# Altium footprint library Misc.PCBLIB: 128 footprints (part 5 of 8)
Each footprint in its own frame and in the unit in brackets; x right, y up, seen from the top. Pads: shape width x height; smd on the part's side, far side on the other; paste and mask are expansions set on the pad; w line width, h text height; cw(c..) or ccw(c..) is an arc to the next point about the centre after c.
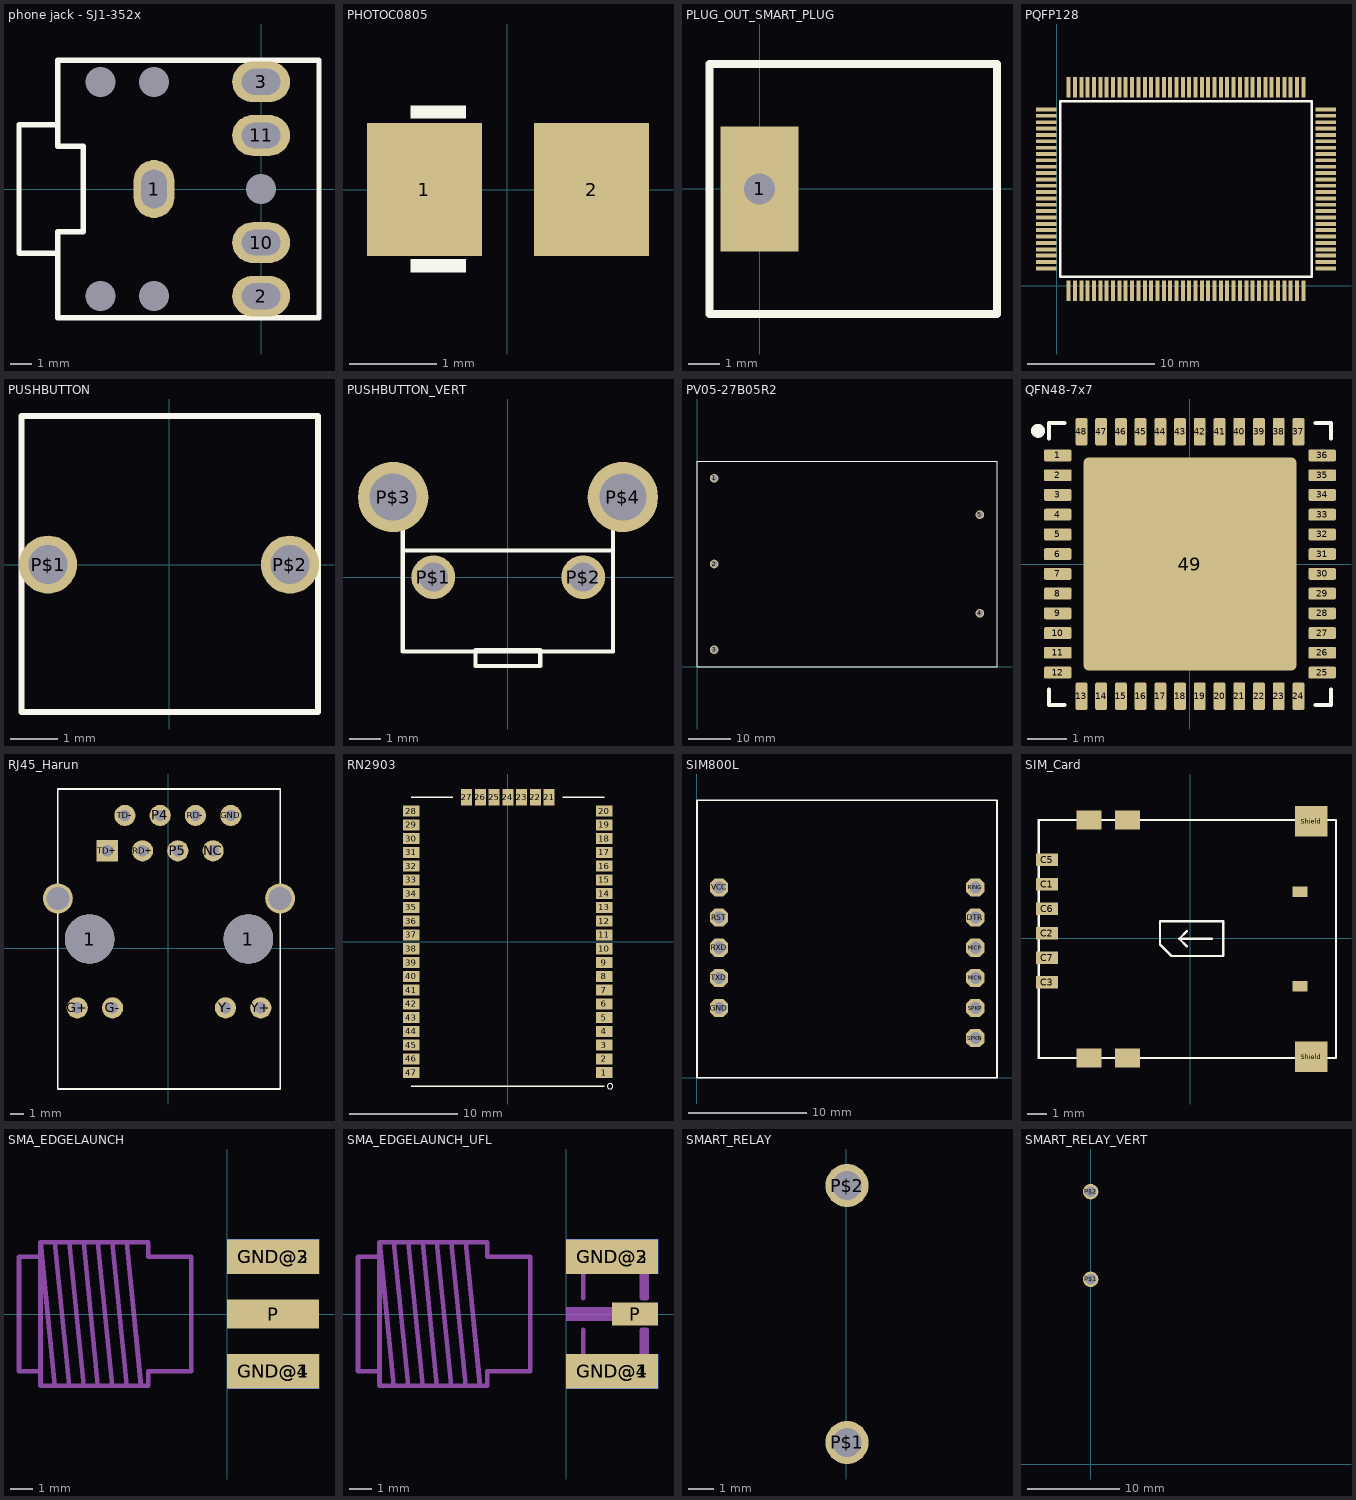
[diagram p4: the footprints below, top view; thin cyan lines are the x and y axes]

## phone jack - SJ1-352x [mm]
pads (10):
  round 0 hole 1.4: 0(-7.5,-5) 0(-7.5,5) 0(-5,-5) 0(-5,5) 0(0,0)
  oval 1.9x2.7 hole 1.2 slot 1.8 at 90 deg: 1(-5,0)
  oval 2.7x1.9 hole 1.2 slot 1.8 at 0 deg: 2(0,-5) 3(0,5) 10(0,-2.5) 11(0,2.5)
Top Overlay:
  lines w0.254: -9.5,-3 -9.5,-2 -8.3,-2 -8.3,2 -9.5,2 -9.5,3 ; -9.5,-3 -9.5,-6 2.7,-6 2.7,6 -9.5,6 -9.5,3 ; -9.5,-3 -11.3,-3 -11.3,3 -9.5,3
3D body "CUI_SJ1-3525NG.step": height 6, standoff -2.8, extent -11.55,-6 2.5,6

## PHOTOC0805 [mil]
pads (2):
  rect 52x60 smd: 1(-37.4,0) 2(38,0)
Top Overlay:
  rectangle: -43.75,32 -18.75,38
  rectangle: -43.75,-37.5 -18.75,-31.25

## PLUG_OUT_SMART_PLUG [mm]
pads (1):
  rect 2.5x4 hole 1 square: 1(0,0)
Top Overlay:
  lines w0.254: -1.6,-4 -1.6,4 7.6,4 7.6,-4 -1.6,-4
3D body "TOMADA_25-09-2017 v1_Terminal saida v1.step": height 13.96, standoff -5, extent -0.35,-4 7.65,4

## PQFP128 [mil]
pads (128):
  rect 12x63 smd: 1(36,-14.96) 2(56,-14.96) 3(76,-14.96) 4(95,-14.96) 5(115,-14.96) 6(135,-14.96) 7(154,-14.96) 8(174,-14.96) 9(194,-14.96) 10(213,-14.96) 11(233,-14.96) 12(253,-14.96) 13(273,-14.96) 14(292,-14.96) 15(312,-14.96) 16(332,-14.96) 17(351,-14.96) 18(371,-14.96) 19(391,-14.96) 20(410,-14.96) 21(430,-14.96) 22(450,-14.96) 23(469,-14.96) 24(489,-14.96) 25(509,-14.96) 26(528,-14.96) 27(548,-14.96) 28(568,-14.96) 29(588,-14.96) 30(607,-14.96) 31(627,-14.96) 32(647,-14.96) 33(666,-14.96) 34(686,-14.96) 35(706,-14.96) 36(725,-14.96) 37(745,-14.96) 38(765,-14.96) 65(765,615) 66(745,615) 67(725,615) 68(706,615) 69(686,615) 70(666,615) 71(647,615) 72(627,615) 73(607,615) 74(588,615) 75(568,615) 76(548,615) 77(528,615) 78(509,615) 79(489,615) 80(469,615) 81(450,615) 82(430,615) 83(410,615) 84(391,615) 85(371,615) 86(351,615) 87(332,615) 88(312,615) 89(292,615) 90(273,615) 91(253,615) 92(233,615) 93(213,615) 94(194,615) 95(174,615) 96(154,615) 97(135,615) 98(115,615) 99(95,615) 100(76,615) 101(56,615) 102(36,615)
  rect 63x12 smd: 39(834,54) 40(834,74) 41(834,94) 42(834,113) 43(834,133) 44(834,153) 45(834,173) 46(834,192) 47(834,212) 48(834,232) 49(834,251) 50(834,271) 51(834,291) 52(834,310) 53(834,330) 54(834,350) 55(834,369) 56(834,389) 57(834,409) 58(834,428) 59(834,448) 60(834,468) 61(834,488) 62(834,507) 63(834,527) 64(834,547) 103(-33.07,547) 104(-33.07,527) 105(-33.07,507) 106(-33.07,488) 107(-33.07,468) 108(-33.07,448) 109(-33.07,428) 110(-33.07,409) 111(-33.07,389) 112(-33.07,369) 113(-33.07,350) 114(-33.07,330) 115(-33.07,310) 116(-33.07,291) 117(-33.07,271) 118(-33.07,251) 119(-33.07,232) 120(-33.07,212) 121(-33.07,192) 122(-33.07,173) 123(-33.07,153) 124(-33.07,133) 125(-33.07,113) 126(-33.07,94) 127(-33.07,74) 128(-33.07,54)
Top Overlay:
  lines w8: 10,28 790,28 790,572 10,572 10,28
3D body "SW3dPS-PQFP128.STEP": height 113.1, standoff -0.48, extent -55.59,-38.19 857.87,639.05

## PUSHBUTTON [mil]
pads (2):
  round 48 hole 32: P$1(-100,0) P$2(100,0)
Top Overlay:
  lines w5: -122.05,-122.05 123,-122.05 123,123 -122.05,123 -122.05,-122.05

## PUSHBUTTON_VERT [mil]
pads (4):
  round 54 hole 36: P$1(-92.13,0) P$2(93,0)
  round 87 hole 58: P$3(-141.73,99) P$4(142,99)
Top Overlay:
  lines w5: -129.92,126 -129.92,33 ; 130,126 130,33 ; -129.92,33 130,33 ; -129.92,33 -129.92,-92.05 130,-92.05 130,33 ; -40,-110 -40,-90 40,-90 40,-110 -40,-110

## PV05-27B05R2 [mm] "Mornsun DC/DC Converter"
pads (5):
  round 2 hole 1.5: 1(4,44) 2(4,24) 3(4,4) 4(66,12.5) 5(66,35.5)
Top Overlay:
  lines w0.254: 0,0 21.83,0 40.78,0 47.64,0 69.78,0 70,0 70,4.02 70,23.35 70,26.57 70,47.72 70,48 0.24,48 0,48 0,0
3D body: height 23.5, standoff 0.1, extent 0,0 70,48

## QFN48-7x7 [mm]
pads (49):
  rrect30% 0.7x0.3 smd: 1(-3.35,2.75) 2(-3.35,2.25) 3(-3.35,1.75) 4(-3.35,1.25) 5(-3.35,0.75) 6(-3.35,0.25) 7(-3.35,-0.25) 8(-3.35,-0.75) 9(-3.35,-1.25) 10(-3.35,-1.75) 11(-3.35,-2.25) 12(-3.35,-2.75) 25(3.35,-2.75) 26(3.35,-2.25) 27(3.35,-1.75) 28(3.35,-1.25) 29(3.35,-0.75) 30(3.35,-0.25) 31(3.35,0.25) 32(3.35,0.75) 33(3.35,1.25) 34(3.35,1.75) 35(3.35,2.25) 36(3.35,2.75)
  rrect30% 0.3x0.7 smd: 13(-2.75,-3.35) 14(-2.25,-3.35) 15(-1.75,-3.35) 16(-1.25,-3.35) 17(-0.75,-3.35) 18(-0.25,-3.35) 19(0.25,-3.35) 20(0.75,-3.35) 21(1.25,-3.35) 22(1.75,-3.35) 23(2.25,-3.35) 24(2.75,-3.35) 37(2.75,3.35) 38(2.25,3.35) 39(1.75,3.35) 40(1.25,3.35) 41(0.75,3.35) 42(0.25,3.35) 43(-0.25,3.35) 44(-0.75,3.35) 45(-1.25,3.35) 46(-1.75,3.35) 47(-2.25,3.35) 48(-2.75,3.35)
  rrect5% 5.4x5.4 smd: 49(0,0)
Top Overlay:
  circle w0.254: c-3.85,3.375 r0.05
  lines w0.1: -3.575,-3.175 -3.575,-3.575 -3.175,-3.575 ; -3.575,3.175 -3.575,3.575 -3.175,3.575 ; 3.175,-3.575 3.575,-3.575 3.575,-3.175 ; 3.175,3.575 3.575,3.575 3.575,3.175
3D body "User Library-QFN48_7x7.step": height 0.78, standoff -0.02, extent -3.51,-3.51 3.51,3.51

## RJ45_Harun [mil]
pads (16):
  round 140 hole 140: 1(-223.5,25.51) 1(226.5,25.51)
  round 60 hole 32: G+(-258.5,-169.49) G-(-158.5,-169.49) GND(176.5,375.51) NC(126.5,275.51) P4(-23.5,375.51) P5(26.5,275.51) RD+(-73.5,275.51) RD-(76.5,375.51) TD-(-123.5,375.51) Y+(261.5,-169.49) Y-(161.5,-169.49)
  round 85 hole 65: SHIELD0(316.5,140.51) SHIELD1(-313.5,140.51)
  rect 60x60 hole 32: TD+(-173.5,275.51)
Top Overlay:
  lines w5: -313.5,-399.49 -313.5,450.51 316.5,450.51 316.5,-399.49 -313.5,-399.49
3D body "User Library-HR911105A.step": height 525, standoff -124.61, extent -313.5,-405.75 311.69,436.77

## RN2903 [mil]
pads (47):
  rect 60x40 smd: 1(350,-475) 2(350,-425) 3(350,-375) 4(350,-325) 5(350,-275) 6(350,-225) 7(350,-175) 8(350,-125) 9(350,-75) 10(350,-25) 11(350,25) 12(350,75) 13(350,125) 14(350,175) 15(350,225) 16(350,275) 17(350,325) 18(350,375) 19(350,425) 20(350,475) 28(-350,475) 29(-350,425) 30(-350,375) 31(-350,325) 32(-350,275) 33(-350,225) 34(-350,175) 35(-350,125) 36(-350,75) 37(-350,25) 38(-350,-25) 39(-350,-75) 40(-350,-125) 41(-350,-175) 42(-350,-225) 43(-350,-275) 44(-350,-325) 45(-350,-375) 46(-350,-425) 47(-350,-475)
  rect 40x60 smd: 21(150,525) 22(100,525) 23(50,525) 24(0,525) 25(-50,525) 26(-100,525) 27(-150,525)
Top Overlay:
  circle w0: c371.26,-524.21 r10
  lines w5: -350,-525 350,-525 ; -350,525 -200,525 ; 200,525 350,525
3D body "User Library-RN2903.step": height 131.5, standoff 0, extent -350,-525 350,525

## SIM800L [mil]
pads (11):
  oct 60x60 hole 40: DTR(923,532) GND(73,232) MICN(923,332) MICP(923,432) RING(923,632) RST(73,532) RXD(73,432) SPKN(923,132) SPKP(923,232) TXD(73,332) VCC(73,632)
Top Overlay:
  lines w5: 0,0 995,0 995,922 0,922 0,0

## SIM_Card [mm] "Sim Card Holder"
pads (14):
  rect 1.15x0.65 smd: C1(-7.45,2.802) C2(-7.45,0.262) C3(-7.45,-2.278) C5(-7.45,4.072) C6(-7.45,1.532) C7(-7.45,-1.008)
  rect 1.3x1 smd: Shield(-5.28,-6.223) Shield(-5.28,6.147) Shield(-3.28,-6.223) Shield(-3.28,6.147)
  rect 1.7x1.6 smd: Shield(6.28,-6.163) Shield(6.28,6.087)
  rect 0.8x0.54 smd: ""(5.7,-2.493) ""(5.7,2.427)
Top Overlay:
  lines w0.127: -0.48,-0.023 1.12,-0.023 ; -0.18,-0.423 -0.58,-0.023 -0.18,0.377 ; -7.88,-6.223 -7.88,6.147 7.57,6.147 7.57,-6.223 -7.88,-6.223 ; -1.58,-0.323 -0.98,-0.923 1.72,-0.923 1.72,0.877 -1.58,0.877 -1.58,-0.323
3D body "786463001.stp": height 1.81, standoff 0.36, extent -8.025,-6.55 7.425,6.5

## SMA_EDGELAUNCH [mil]
pads (5):
  rect 160x60 smd paste-80: GND@1(80,-100) GND@2(80,100)
  rect 160x60 smd far side paste-80: GND@3(80,100) GND@4(80,-100)
  rect 160x50 smd paste-80: P(80,0)
Mechanical 4:
  rectangle: 0,-12.5 125,12.5
  region: 0,0 10,0 10,10 0,10
  region: 0,0 10,0 10,10 0,10
  lines w8: -150,-125 -175,125 ; -325,-100 -325,100 ; -325,-100 -362.5,-100 -362.5,100 -325,100 ; -325,-100 -325,-125 -300,-125 ; -325,100 -325,125 ; -325,125 -300,-125 ; -325,125 -300,125 ; -300,-125 -275,-125 ; -300,125 -275,-125 ; -300,125 -275,125 ; -275,-125 -250,-125 ; -275,125 -250,-125 ; -275,125 -250,125 ; -250,-125 -225,-125 ; -250,125 -225,-125 ; -250,125 -225,125 ; -225,-125 -200,-125 ; -225,125 -200,-125 ; -225,125 -200,125 ; -200,-125 -175,-125 ; -200,125 -175,-125 ; -200,125 -175,125 ; -175,-125 -137.5,-125 -137.5,-100 -62.5,-100 -62.5,100 -137.5,100 -137.5,125 -175,125
3D body "User Library-SMA-106.step": height 140.16, standoff -109.84, extent -521.65,-124.99 163.39,125

## SMA_EDGELAUNCH_UFL [mil]
pads (5):
  rect 160x60 smd paste-80: GND@1(80,-100) GND@2(80,100)
  rect 160x60 smd far side paste-80: GND@3(80,100) GND@4(80,-100)
  rect 80x40 smd paste-40: P(120,0)
Top Paste:
  rectangle: 126,-19 156,19
  rectangle: 39,38.94 123,70.94
  region: 123,-38.94 39,-38.94 39,-70.94 123,-70.94
Top Solder:
  rectangle: 35,36.94 127,72.94
  region: 127,-36.94 35,-36.94 35,-72.94 127,-72.94
Mechanical 4:
  rectangle: 0,-12.5 125,12.5
  region: 0,0 10,0 10,10 0,10
  region: 0,0 10,0 10,10 0,10
  lines w8: -150,-125 -175,125 ; 29.82,-27.56 29.82,-82.68 132.18,-82.68 ; 29.82,27.56 29.82,82.68 132.18,82.68 ; 136.12,-78.74 136.12,-27.56 ; 136.12,27.56 136.12,78.74 ; -325,-100 -325,-125 -300,-125 ; -325,-100 -362.5,-100 -362.5,100 -325,100 ; -325,-100 -325,100 ; -325,100 -325,125 ; -325,125 -300,125 ; -325,125 -300,-125 ; -300,-125 -275,-125 ; -300,125 -275,125 ; -300,125 -275,-125 ; -275,-125 -250,-125 ; -275,125 -250,125 ; -275,125 -250,-125 ; -250,-125 -225,-125 ; -250,125 -225,125 ; -250,125 -225,-125 ; -225,-125 -200,-125 ; -225,125 -200,125 ; -225,125 -200,-125 ; -200,-125 -175,-125 ; -200,125 -175,125 ; -200,125 -175,-125 ; -175,-125 -137.5,-125 -137.5,-100 -62.5,-100 -62.5,100 -137.5,100 -137.5,125 -175,125 ; 132.18,-82.68 132.18,-27.56 140.06,-27.56 140.06,-82.68 132.18,-82.68 ; 132.18,82.68 132.18,27.56 140.06,27.56 140.06,82.68 132.18,82.68
3D body "User Library-SMA-106.step": height 140.16, standoff -109.84, extent -500,-125 185.04,125

## SMART_RELAY [mil]
pads (2):
  round 66 hole 44: P$1(1,-512.6) P$2(1,-118.9)

## SMART_RELAY_VERT [mil]
pads (2):
  round 66 hole 44: P$1(0,788) P$2(0,1162)
Bottom Overlay:
  lines w5: 0,0 847,0 847,1280 0,1280 0,0